# Altium footprint library ALL.PcbLib: 385 footprints (part 12 of 25)
Each footprint in its own frame and in the unit in brackets; x right, y up, seen from the top. Pads: shape width x height; smd on the part's side, far side on the other; paste and mask are expansions set on the pad; w line width, h text height; cw(c..) or ccw(c..) is an arc to the next point about the centre after c.
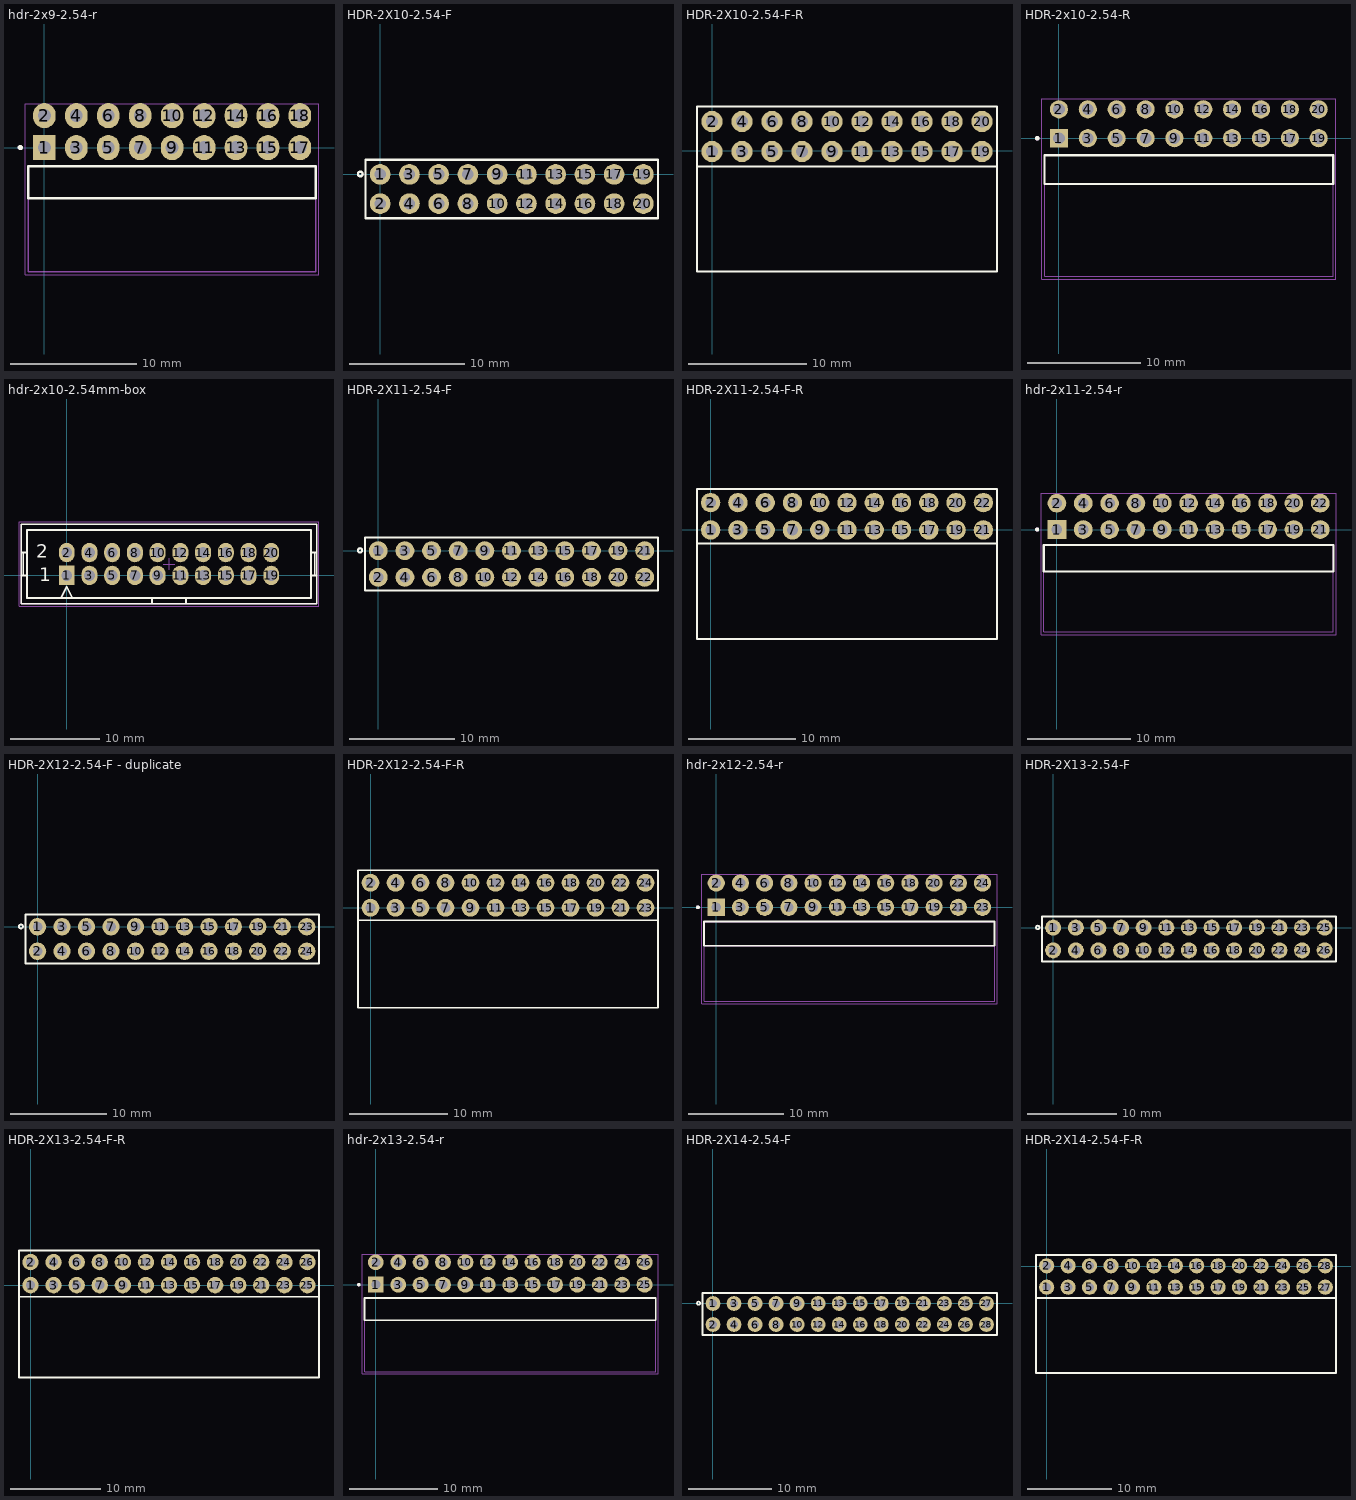
[diagram p11: the footprints below, top view; thin cyan lines are the x and y axes]

## hdr-2x9-2.54-r [mm]
pads (18):
  rect 1.8x2 hole 1.02: 1(0,0)
  oval 1.8x2 hole 1.02: 2(0,2.54) 3(2.54,0) 4(2.54,2.54) 5(5.08,0) 6(5.08,2.54) 7(7.62,0) 8(7.62,2.54) 9(10.16,0) 10(10.16,2.54) 11(12.7,0) 12(12.7,2.54) 13(15.24,0) 14(15.24,2.54) 15(17.78,0) 16(17.78,2.54) 17(20.32,0) 18(20.32,2.54)
Top Overlay:
  circle w0.2: c-1.92,0 r0.1
  lines w0.2: -1.27,-4.04 -1.27,-1.5 21.59,-1.5 21.59,-4.04 -1.27,-4.04
Mechanical 13:
  circle w0.2: c-1.92,0 r0.1
  lines w0.1: -1.27,-4.04 -1.27,-1.5 21.59,-1.5 21.59,-4.04 ; -1.27,-4.04 21.59,-4.04 ; -1.27,-4.04 -1.27,-9.88 21.59,-9.88 21.59,-4.04
Mechanical 15:
  lines w0.05: -1.52,-10.13 -1.52,3.475 21.84,3.475 21.84,-10.13 -1.52,-10.13
3D body "TSW-109-08-S-D-RA.stp": height 5.54, standoff -2.31, extent -1.143,-9.914 21.717,2.85

## HDR-2X10-2.54-F [mm]
pads (20):
  round 1.8 hole 1: 1(0,0) 2(0,-2.54) 3(2.54,0) 4(2.54,-2.54) 5(5.08,0) 6(5.08,-2.54) 7(7.62,0) 8(7.62,-2.54) 9(10.16,0) 10(10.16,-2.54) 11(12.7,0) 12(12.7,-2.54) 13(15.24,0) 14(15.24,-2.54) 15(17.78,0) 16(17.78,-2.54) 17(20.32,0) 18(20.32,-2.54) 19(22.86,0) 20(22.86,-2.54)
Top Overlay:
  circle w0.2: c-1.73,0.03 r0.2
  lines w0.2: -1.27,-3.81 -1.27,1.27 24.13,1.27 24.13,-3.81 -1.27,-3.81
3D body "PBD-2.stp": height 8.5, standoff -3.15, extent 19.05,-3.81 21.59,1.27
3D body "PBD-2.stp": height 8.5, standoff -3.15, extent 21.59,-3.81 24.13,1.27
3D body "PBD-2.stp": height 8.5, standoff -3.15, extent 13.97,-3.81 16.51,1.27
3D body "PBD-2.stp": height 8.5, standoff -3.15, extent 16.51,-3.81 19.05,1.27
3D body "PBD-2.stp": height 8.5, standoff -3.15, extent 8.89,-3.81 11.43,1.27
3D body "PBD-2.stp": height 8.5, standoff -3.15, extent 11.43,-3.81 13.97,1.27
3D body "PBD-2.stp": height 8.5, standoff -3.15, extent 3.81,-3.81 6.35,1.27
3D body "PBD-2.stp": height 8.5, standoff -3.15, extent 6.35,-3.81 8.89,1.27
3D body "PBD-2.stp": height 8.5, standoff -3.15, extent -1.27,-3.81 1.27,1.27
3D body "PBD-2.stp": height 8.5, standoff -3.15, extent 1.27,-3.81 3.81,1.27

## HDR-2X10-2.54-F-R [mm]
pads (20):
  round 1.8 hole 1: 1(0,-0.076) 2(0,2.464) 3(2.54,-0.076) 4(2.54,2.464) 5(5.08,-0.076) 6(5.08,2.464) 7(7.62,-0.076) 8(7.62,2.464) 9(10.16,-0.076) 10(10.16,2.464) 11(12.7,-0.076) 12(12.7,2.464) 13(15.24,-0.076) 14(15.24,2.464) 15(17.78,-0.076) 16(17.78,2.464) 17(20.32,-0.076) 18(20.32,2.464) 19(22.86,-0.076) 20(22.86,2.464)
Top Overlay:
  lines w0.2: -1.27,-1.346 -1.27,-10.236 24.13,-10.236 24.13,-1.346 ; -1.27,-1.346 24.13,-1.346 ; -1.27,-1.346 -1.27,3.734 24.13,3.734 24.13,-1.346
3D body "PBD-20R.step": height 5, standoff -3, extent -1.27,-10.236 24.13,2.764

## HDR-2x10-2.54-R [mm]
pads (20):
  rect 1.6x1.6 hole 1.02: 1(0,0)
  round 1.6 hole 1.02: 2(0,2.54) 3(2.54,0) 4(2.54,2.54) 5(5.08,0) 6(5.08,2.54) 7(7.62,0) 8(7.62,2.54) 9(10.16,0) 10(10.16,2.54) 11(12.7,0) 12(12.7,2.54) 13(15.24,0) 14(15.24,2.54) 15(17.78,0) 16(17.78,2.54) 17(20.32,0) 18(20.32,2.54) 19(22.86,0) 20(22.86,2.54)
Top Overlay:
  circle w0.2: c-1.92,0 r0.1
  lines w0.2: -1.27,-4.04 -1.27,-1.5 24.13,-1.5 24.13,-4.04 -1.27,-4.04
Mechanical 13:
  circle w0.2: c-1.92,0 r0.1
  lines w0.1: -1.27,-4.04 -1.27,-1.5 24.13,-1.5 24.13,-4.04 ; -1.27,-4.04 24.13,-4.04 ; -1.27,-4.04 -1.27,-12.17 24.13,-12.17 24.13,-4.04
Mechanical 15:
  lines w0.05: -1.52,-12.42 -1.52,3.475 24.38,3.475 24.38,-12.42 -1.52,-12.42
3D body "TSW-110-25-T-D-RA.stp": height 5.54, standoff -2.56, extent -1.194,-12.198 24.206,2.851

## hdr-2x10-2.54mm-box [mil]
pads (20):
  rect 70x85 hole 48: 1(0,0)
  oval 70x85 hole 48: 2(0,100) 3(100,0) 4(100,100) 5(200,0) 6(200,100) 7(300,0) 8(300,100) 9(400,0) 10(400,100) 11(500,0) 12(500,100) 13(600,0) 14(600,100) 15(700,0) 16(700,100) 17(800,0) 18(800,100) 19(900,0) 20(900,100)
Top Overlay:
  lines w8: -200,0 -175,0 ; -200,100 -175,100 ; -191.67,0 -191.67,100 ; -25,-100 0,-50 25,-100 ; 375,-125 375,-100 ; 525,-125 525,-100 ; 1075,0 1100,0 ; 1075,100 1100,100 ; 1091.67,0 1091.67,100 ; 375,-100 525,-100 ; 375,-100 -175,-100 -175,200 1075,200 1075,-100 525,-100 ; -200,-125 1100,-125 1100,225 -200,225 -200,-125
  text "1" at -122,-25 h60
  text "2" at -135,77 h60
Mechanical 13:
  drawing of 172 lines, arcs and shapes, not listed
Mechanical 15:
  lines w3.94: 425,50 450,50 ; 450,25 450,50 ; 450,75 450,50 ; 475,50 450,50 ; -210,-135 -210,235 1110,235 1110,-135 -210,-135
3D body: height 118.11, standoff 0, extent 375.02,-124.98 524.98,-100.02
3D body: height 78.74, standoff 0, extent -174.98,-99.98 1074.98,199.98
3D body: height 346.46, standoff 0, extent -199.98,-124.98 1099.98,224.98
3D body: height 314.96, standoff -129.92, extent -12.48,-12.48 12.48,12.48
3D body: height 314.96, standoff -129.92, extent 87.52,-12.48 112.48,12.48
3D body: height 314.96, standoff -129.92, extent 87.52,87.52 112.48,112.48
3D body: height 314.96, standoff -129.92, extent -12.48,87.52 12.48,112.48
3D body: height 314.96, standoff -129.92, extent 187.52,-12.48 212.48,12.48
3D body: height 314.96, standoff -129.92, extent 287.52,-12.48 312.48,12.48
3D body: height 314.96, standoff -129.92, extent 287.52,87.52 312.48,112.48
3D body: height 314.96, standoff -129.92, extent 187.52,87.52 212.48,112.48
3D body: height 314.96, standoff -129.92, extent 387.52,-12.48 412.48,12.48
3D body: height 314.96, standoff -129.92, extent 487.52,-12.48 512.48,12.48
3D body: height 314.96, standoff -129.92, extent 487.52,87.52 512.48,112.48
3D body: height 314.96, standoff -129.92, extent 387.52,87.52 412.48,112.48
3D body: height 314.96, standoff -129.92, extent 587.52,-12.48 612.48,12.48
3D body: height 314.96, standoff -129.92, extent 687.52,-12.48 712.48,12.48
3D body: height 314.96, standoff -129.92, extent 687.52,87.52 712.48,112.48
3D body: height 314.96, standoff -129.92, extent 587.52,87.52 612.48,112.48
3D body: height 314.96, standoff -129.92, extent 787.52,-12.48 812.48,12.48
3D body: height 314.96, standoff -129.92, extent 887.52,-12.48 912.48,12.48
3D body: height 314.96, standoff -129.92, extent 887.52,87.52 912.48,112.48
3D body: height 314.96, standoff -129.92, extent 787.52,87.52 812.48,112.48

## HDR-2X11-2.54-F [mm]
pads (22):
  round 1.8 hole 1: 1(0,0) 2(0,-2.54) 3(2.54,0) 4(2.54,-2.54) 5(5.08,0) 6(5.08,-2.54) 7(7.62,0) 8(7.62,-2.54) 9(10.16,0) 10(10.16,-2.54) 11(12.7,0) 12(12.7,-2.54) 13(15.24,0) 14(15.24,-2.54) 15(17.78,0) 16(17.78,-2.54) 17(20.32,0) 18(20.32,-2.54) 19(22.86,0) 20(22.86,-2.54) 21(25.4,0) 22(25.4,-2.54)
Top Overlay:
  circle w0.2: c-1.73,0.03 r0.2
  lines w0.2: -1.27,-3.81 26.67,-3.81 26.67,1.27 -1.27,1.27 -1.27,-3.81
3D body "PBD-2.stp": height 8.5, standoff -3.15, extent 24.13,-3.81 26.67,1.27
3D body "PBD-2.stp": height 8.5, standoff -3.15, extent 21.59,-3.81 24.13,1.27
3D body "PBD-2.stp": height 8.5, standoff -3.15, extent 3.81,-3.81 6.35,1.27
3D body "PBD-2.stp": height 8.5, standoff -3.15, extent -1.27,-3.81 1.27,1.27
3D body "PBD-2.stp": height 8.5, standoff -3.15, extent 1.27,-3.81 3.81,1.27
3D body "PBD-2.stp": height 8.5, standoff -3.15, extent 11.43,-3.81 13.97,1.27
3D body "PBD-2.stp": height 8.5, standoff -3.15, extent 6.35,-3.81 8.89,1.27
3D body "PBD-2.stp": height 8.5, standoff -3.15, extent 8.89,-3.81 11.43,1.27
3D body "PBD-2.stp": height 8.5, standoff -3.15, extent 19.05,-3.81 21.59,1.27
3D body "PBD-2.stp": height 8.5, standoff -3.15, extent 13.97,-3.81 16.51,1.27
3D body "PBD-2.stp": height 8.5, standoff -3.15, extent 16.51,-3.81 19.05,1.27

## HDR-2X11-2.54-F-R [mm]
pads (22):
  round 1.8 hole 1: 1(0,0) 2(0,2.54) 3(2.54,0) 4(2.54,2.54) 5(5.08,0) 6(5.08,2.54) 7(7.62,0) 8(7.62,2.54) 9(10.16,0) 10(10.16,2.54) 11(12.7,0) 12(12.7,2.54) 13(15.24,0) 14(15.24,2.54) 15(17.78,0) 16(17.78,2.54) 17(20.32,0) 18(20.32,2.54) 19(22.86,0) 20(22.86,2.54) 21(25.4,0) 22(25.4,2.54)
Top Overlay:
  lines w0.2: -1.27,-1.27 -1.27,-10.16 26.67,-10.16 26.67,-1.27 ; -1.27,-1.27 26.67,-1.27 ; -1.27,-1.27 -1.27,3.81 26.67,3.81 26.67,-1.27
3D body "PBD-22R.step": height 5, standoff -3, extent -1.27,-10.16 26.67,2.84

## hdr-2x11-2.54-r [mm]
pads (22):
  rect 1.8x1.8 hole 1.02: 1(0,0)
  round 1.8 hole 1.02: 2(0,2.54) 3(2.54,0) 4(2.54,2.54) 5(5.08,0) 6(5.08,2.54) 7(7.62,0) 8(7.62,2.54) 9(10.16,0) 10(10.16,2.54) 11(12.7,0) 12(12.7,2.54) 13(15.24,0) 14(15.24,2.54) 15(17.78,0) 16(17.78,2.54) 17(20.32,0) 18(20.32,2.54) 19(22.86,0) 20(22.86,2.54) 21(25.4,0) 22(25.4,2.54)
Top Overlay:
  circle w0.2: c-1.92,0 r0.1
  lines w0.2: -1.27,-4.04 -1.27,-1.5 26.67,-1.5 26.67,-4.04 -1.27,-4.04
Mechanical 13:
  circle w0.2: c-1.92,0 r0.1
  lines w0.1: -1.27,-4.04 -1.27,-1.5 26.67,-1.5 26.67,-4.04 ; -1.27,-4.04 26.67,-4.04 ; -1.27,-4.04 -1.27,-9.88 26.67,-9.88 26.67,-4.04
Mechanical 15:
  lines w0.05: -1.52,-10.13 -1.52,3.475 26.92,3.475 26.92,-10.13 -1.52,-10.13
3D body "TSW-111-08-S-D-RA.stp": height 5.54, standoff -2.31, extent -1.397,-9.938 26.543,2.826

## HDR-2X12-2.54-F - duplicate [mm]
pads (24):
  round 1.8 hole 1: 1(0,0) 2(0,-2.54) 3(2.54,0) 4(2.54,-2.54) 5(5.08,0) 6(5.08,-2.54) 7(7.62,0) 8(7.62,-2.54) 9(10.16,0) 10(10.16,-2.54) 11(12.7,0) 12(12.7,-2.54) 13(15.24,0) 14(15.24,-2.54) 15(17.78,0) 16(17.78,-2.54) 17(20.32,0) 18(20.32,-2.54) 19(22.86,0) 20(22.86,-2.54) 21(25.4,0) 22(25.4,-2.54) 23(27.94,0) 24(27.94,-2.54)
Top Overlay:
  circle w0.2: c-1.73,0.03 r0.2
  lines w0.2: -1.27,-3.81 -1.27,1.27 29.21,1.27 29.21,-3.81 -1.27,-3.81
3D body "PBD-2.stp": height 8.5, standoff -3.15, extent 3.81,-3.81 6.35,1.27
3D body "PBD-2.stp": height 8.5, standoff -3.15, extent -1.27,-3.81 1.27,1.27
3D body "PBD-2.stp": height 8.5, standoff -3.15, extent 1.27,-3.81 3.81,1.27
3D body "PBD-2.stp": height 8.5, standoff -3.15, extent 11.43,-3.81 13.97,1.27
3D body "PBD-2.stp": height 8.5, standoff -3.15, extent 6.35,-3.81 8.89,1.27
3D body "PBD-2.stp": height 8.5, standoff -3.15, extent 8.89,-3.81 11.43,1.27
3D body "PBD-2.stp": height 8.5, standoff -3.15, extent 19.05,-3.81 21.59,1.27
3D body "PBD-2.stp": height 8.5, standoff -3.15, extent 13.97,-3.81 16.51,1.27
3D body "PBD-2.stp": height 8.5, standoff -3.15, extent 16.51,-3.81 19.05,1.27
3D body "PBD-2.stp": height 8.5, standoff -3.15, extent 26.67,-3.81 29.21,1.27
3D body "PBD-2.stp": height 8.5, standoff -3.15, extent 21.59,-3.81 24.13,1.27
3D body "PBD-2.stp": height 8.5, standoff -3.15, extent 24.13,-3.81 26.67,1.27

## HDR-2X12-2.54-F-R [mm]
pads (24):
  round 1.8 hole 1: 1(0,0) 2(0,2.54) 3(2.54,0) 4(2.54,2.54) 5(5.08,0) 6(5.08,2.54) 7(7.62,0) 8(7.62,2.54) 9(10.16,0) 10(10.16,2.54) 11(12.7,0) 12(12.7,2.54) 13(15.24,0) 14(15.24,2.54) 15(17.78,0) 16(17.78,2.54) 17(20.32,0) 18(20.32,2.54) 19(22.86,0) 20(22.86,2.54) 21(25.4,0) 22(25.4,2.54) 23(27.94,0) 24(27.94,2.54)
Top Overlay:
  lines w0.2: -1.27,-1.27 -1.27,-10.16 29.21,-10.16 29.21,-1.27 ; -1.27,-1.27 -1.27,3.81 29.21,3.81 29.21,-1.27 ; -1.27,-1.27 29.21,-1.27
3D body "PBD-24R.step": height 5, standoff -3, extent -1.27,-10.16 29.21,2.84

## hdr-2x12-2.54-r [mm]
pads (24):
  rect 1.8x1.8 hole 1.02: 1(0,0)
  round 1.8 hole 1.02: 2(0,2.54) 3(2.54,0) 4(2.54,2.54) 5(5.08,0) 6(5.08,2.54) 7(7.62,0) 8(7.62,2.54) 9(10.16,0) 10(10.16,2.54) 11(12.7,0) 12(12.7,2.54) 13(15.24,0) 14(15.24,2.54) 15(17.78,0) 16(17.78,2.54) 17(20.32,0) 18(20.32,2.54) 19(22.86,0) 20(22.86,2.54) 21(25.4,0) 22(25.4,2.54) 23(27.94,0) 24(27.94,2.54)
Top Overlay:
  circle w0.2: c-1.92,0 r0.1
  lines w0.2: -1.27,-4.04 -1.27,-1.5 29.21,-1.5 29.21,-4.04 -1.27,-4.04
Mechanical 13:
  circle w0.2: c-1.92,0 r0.1
  lines w0.1: -1.27,-4.04 -1.27,-1.5 29.21,-1.5 29.21,-4.04 ; -1.27,-4.04 29.21,-4.04 ; -1.27,-4.04 -1.27,-9.88 29.21,-9.88 29.21,-4.04
Mechanical 15:
  lines w0.05: -1.52,-10.13 -1.52,3.475 29.46,3.475 29.46,-10.13 -1.52,-10.13
3D body "TSW-112-08-S-D-RA.stp": height 5.59, standoff -2.26, extent -1.27,-9.882 29.21,2.881

## HDR-2X13-2.54-F [mm]
pads (26):
  round 1.8 hole 1: 1(0,0) 2(0,-2.54) 3(2.54,0) 4(2.54,-2.54) 5(5.08,0) 6(5.08,-2.54) 7(7.62,0) 8(7.62,-2.54) 9(10.16,0) 10(10.16,-2.54) 11(12.7,0) 12(12.7,-2.54) 13(15.24,0) 14(15.24,-2.54) 15(17.78,0) 16(17.78,-2.54) 17(20.32,0) 18(20.32,-2.54) 19(22.86,0) 20(22.86,-2.54) 21(25.4,0) 22(25.4,-2.54) 23(27.94,0) 24(27.94,-2.54) 25(30.48,0) 26(30.48,-2.54)
Top Overlay:
  circle w0.2: c-1.73,0.03 r0.2
  lines w0.2: -1.27,-3.81 -1.27,1.27 31.75,1.27 31.75,-3.81 -1.27,-3.81
3D body "PBD-2.stp": height 8.5, standoff -3.15, extent 24.13,-3.81 26.67,1.27
3D body "PBD-2.stp": height 8.5, standoff -3.15, extent 21.59,-3.81 24.13,1.27
3D body "PBD-2.stp": height 8.5, standoff -3.15, extent 26.67,-3.81 29.21,1.27
3D body "PBD-2.stp": height 8.5, standoff -3.15, extent 16.51,-3.81 19.05,1.27
3D body "PBD-2.stp": height 8.5, standoff -3.15, extent 13.97,-3.81 16.51,1.27
3D body "PBD-2.stp": height 8.5, standoff -3.15, extent 19.05,-3.81 21.59,1.27
3D body "PBD-2.stp": height 8.5, standoff -3.15, extent 8.89,-3.81 11.43,1.27
3D body "PBD-2.stp": height 8.5, standoff -3.15, extent 6.35,-3.81 8.89,1.27
3D body "PBD-2.stp": height 8.5, standoff -3.15, extent 11.43,-3.81 13.97,1.27
3D body "PBD-2.stp": height 8.5, standoff -3.15, extent 1.27,-3.81 3.81,1.27
3D body "PBD-2.stp": height 8.5, standoff -3.15, extent -1.27,-3.81 1.27,1.27
3D body "PBD-2.stp": height 8.5, standoff -3.15, extent 3.81,-3.81 6.35,1.27
3D body "PBD-2.stp": height 8.5, standoff -3.15, extent 29.21,-3.81 31.75,1.27

## HDR-2X13-2.54-F-R [mm]
pads (26):
  round 1.8 hole 1: 1(0,0) 2(0,2.54) 3(2.54,0) 4(2.54,2.54) 5(5.08,0) 6(5.08,2.54) 7(7.62,0) 8(7.62,2.54) 9(10.16,0) 10(10.16,2.54) 11(12.7,0) 12(12.7,2.54) 13(15.24,0) 14(15.24,2.54) 15(17.78,0) 16(17.78,2.54) 17(20.32,0) 18(20.32,2.54) 19(22.86,0) 20(22.86,2.54) 21(25.4,0) 22(25.4,2.54) 23(27.94,0) 24(27.94,2.54) 25(30.48,0) 26(30.48,2.54)
Top Overlay:
  lines w0.2: -1.27,-1.27 -1.27,-10.16 31.75,-10.16 31.75,-1.27 ; -1.27,-1.27 -1.27,3.81 31.75,3.81 31.75,-1.27 ; -1.27,-1.27 31.75,-1.27
3D body "PBD-26R.step": height 5, standoff -3, extent -1.27,-10.16 31.75,2.84

## hdr-2x13-2.54-r [mm]
pads (26):
  rect 1.8x1.8 hole 1.02: 1(0,0)
  round 1.8 hole 1.02: 2(0,2.54) 3(2.54,0) 4(2.54,2.54) 5(5.08,0) 6(5.08,2.54) 7(7.62,0) 8(7.62,2.54) 9(10.16,0) 10(10.16,2.54) 11(12.7,0) 12(12.7,2.54) 13(15.24,0) 14(15.24,2.54) 15(17.78,0) 16(17.78,2.54) 17(20.32,0) 18(20.32,2.54) 19(22.86,0) 20(22.86,2.54) 21(25.4,0) 22(25.4,2.54) 23(27.94,0) 24(27.94,2.54) 25(30.48,0) 26(30.48,2.54)
Top Overlay:
  circle w0.2: c-1.92,0 r0.1
  lines w0.2: -1.27,-4.04 31.75,-4.04 31.75,-1.5 -1.27,-1.5 -1.27,-4.04
Mechanical 13:
  circle w0.2: c-1.92,0 r0.1
  lines w0.1: -1.27,-4.04 -1.27,-9.88 31.75,-9.88 31.75,-4.04 ; -1.27,-4.04 31.75,-4.04 ; -1.27,-4.04 -1.27,-1.5 31.75,-1.5 31.75,-4.04
Mechanical 15:
  lines w0.05: -1.52,-10.13 32,-10.13 32,3.475 -1.52,3.475 -1.52,-10.13
3D body "TSW-113-25-T-D-RA.stp": height 5.54, standoff -2.56, extent -1.27,-12.046 31.75,3.004

## HDR-2X14-2.54-F [mm]
pads (28):
  round 1.8 hole 1: 1(0,0) 2(0,-2.54) 3(2.54,0) 4(2.54,-2.54) 5(5.08,0) 6(5.08,-2.54) 7(7.62,0) 8(7.62,-2.54) 9(10.16,0) 10(10.16,-2.54) 11(12.7,0) 12(12.7,-2.54) 13(15.24,0) 14(15.24,-2.54) 15(17.78,0) 16(17.78,-2.54) 17(20.32,0) 18(20.32,-2.54) 19(22.86,0) 20(22.86,-2.54) 21(25.4,0) 22(25.4,-2.54) 23(27.94,0) 24(27.94,-2.54) 25(30.48,0) 26(30.48,-2.54) 27(33.02,0) 28(33.02,-2.54)
Top Overlay:
  circle w0.2: c-1.73,0.03 r0.2
  lines w0.2: -1.27,-3.81 34.29,-3.81 34.29,1.27 -1.27,1.27 -1.27,-3.81
3D body "PBD-2.stp": height 8.5, standoff -3.15, extent 31.75,-3.81 34.29,1.27
3D body "PBD-2.stp": height 8.5, standoff -3.15, extent 29.21,-3.81 31.75,1.27
3D body "PBD-2.stp": height 8.5, standoff -3.15, extent 3.81,-3.81 6.35,1.27
3D body "PBD-2.stp": height 8.5, standoff -3.15, extent -1.27,-3.81 1.27,1.27
3D body "PBD-2.stp": height 8.5, standoff -3.15, extent 1.27,-3.81 3.81,1.27
3D body "PBD-2.stp": height 8.5, standoff -3.15, extent 11.43,-3.81 13.97,1.27
3D body "PBD-2.stp": height 8.5, standoff -3.15, extent 6.35,-3.81 8.89,1.27
3D body "PBD-2.stp": height 8.5, standoff -3.15, extent 8.89,-3.81 11.43,1.27
3D body "PBD-2.stp": height 8.5, standoff -3.15, extent 19.05,-3.81 21.59,1.27
3D body "PBD-2.stp": height 8.5, standoff -3.15, extent 13.97,-3.81 16.51,1.27
3D body "PBD-2.stp": height 8.5, standoff -3.15, extent 16.51,-3.81 19.05,1.27
3D body "PBD-2.stp": height 8.5, standoff -3.15, extent 26.67,-3.81 29.21,1.27
3D body "PBD-2.stp": height 8.5, standoff -3.15, extent 21.59,-3.81 24.13,1.27
3D body "PBD-2.stp": height 8.5, standoff -3.15, extent 24.13,-3.81 26.67,1.27

## HDR-2X14-2.54-F-R [mm]
pads (28):
  round 1.8 hole 1: 1(-0.025,-2.515) 2(-0.025,0.025) 3(2.515,-2.515) 4(2.515,0.025) 5(5.055,-2.515) 6(5.055,0.025) 7(7.595,-2.515) 8(7.595,0.025) 9(10.135,-2.515) 10(10.135,0.025) 11(12.675,-2.515) 12(12.675,0.025) 13(15.215,-2.515) 14(15.215,0.025) 15(17.755,-2.515) 16(17.755,0.025) 17(20.295,-2.515) 18(20.295,0.025) 19(22.835,-2.515) 20(22.835,0.025) 21(25.375,-2.515) 22(25.375,0.025) 23(27.915,-2.515) 24(27.915,0.025) 25(30.455,-2.515) 26(30.455,0.025) 27(32.995,-2.515) 28(32.995,0.025)
Top Overlay:
  lines w0.2: -1.295,-3.785 34.265,-3.785 ; -1.295,-3.785 -1.295,1.295 34.265,1.295 34.265,-3.785 ; -1.295,-3.785 -1.295,-12.675 34.265,-12.675 34.265,-3.785
3D body "PBD-28R.step": height 5, standoff -3, extent -1.295,-12.675 34.265,0.325